# Altium integrated library Jack_LibraryLibPkg.IntLib: 77 symbols (continued)
## OPA2188AIDR (continued)
footprint SOIC8 (OPA2188AIDR) (SOIC, 8-Leads, Body 4.90x3.90mm, Pitch 1.27mm IPC Low Density)
pins on every part: 4 V- (power), 8 V+ (power)
part A pins: 1 OUT A (out), 2 IN A- (in), 3 IN A+ (in)
part B pins: 5 IN B+ (in), 6 IN B- (in), 7 OUT B (out)

## PL2303GL
designator U?
UART to USB 1.1 Bridge; Manufacturer: Prolific Tech; Supplier: LCSC; Supplier Part Number: C2905408; Manufacturer Part Number: PL2303GL
footprint SOP8 (SOP, 8-Leads, Body 4.90x3.90mm, Pitch 1.27mm, IPC Medium Density)
pins: 1 GND, 2 TX (out), 3 VDDIO, 4 RX (in), 5 DP, 6 DM, 7 VIN, 8 VO_33

## Solder_Bridge
designator J?  (value not drawn)
footprint Solder Jumper
pins: 1, 2

## SS210
designator D?  (value not drawn)
Schottky Diode, 2A 100V; Manufacturer: MDD(Microdiode Semiconductor); Manufacturer Part Number: SS210; Supplier: LCSC; Supplier Part Number: C14996
footprint DO-214AC Diode (Molded Diode, 2-Leads, Body 4.15x2.55mm, IPC Medium Density)
pins: 1 A, 2 K

## STM32F103C8T6
designator U?
MCU 32-bit STM32F1 ARM Cortex M3 RISC 64KB Flash 2.5V/3.3V 48-Pin LQFP Tray; Manufacturer: STMicroelectronics; ComponentLink3Description: Package Specification; ComponentLink3URL: http://www.st.com/st-web-ui/static/active/en/resource/technical/document/datasheet/DM00058181.pdf; ComponentLink1URL: http://www.st.com/web/en/home.html; ComponentLink2URL: http://www.st.com/st-web-ui/static/active/en/resource/technical/document/datasheet/CD00161566.pdf; ComponentLink1Description: Manufacturer URL; ComponentLink2Description: Datasheet; Supplier: LCSC; Supplier Part Number: C8734; Manufacturer Part Number: STM32F103C8T6; ComponentLink4URL: https://datasheet.octopart.com:443/STM32F103C8T6-STMicroelectronics-datasheet-177520228.pdf?src-supplier=IHS; ComponentLink4Description: https://datasheet.octopart.com:443/STM32F103C8T6-STMicroelectronics-datasheet-177520228.pdf?src-supplier=IHS; ComponentLink5URL: https://datasheet.octopart.com:443/STM32F103C8T6-STMicroelectronics-datasheet-10330614.pdf?src-supplier=Newark; ComponentLink5Description: https://datasheet.octopart.com:443/STM32F103C8T6-STMicroelectronics-datasheet-10330614.pdf?src-supplier=Newark; ComponentLink6URL: https://datasheet.octopart.com:443/STM32F103C8T6-STMicroelectronics-datasheet-16839800.pdf?src-supplier=Newark; ComponentLink6Description: https://datasheet.octopart.com:443/STM32F103C8T6-STMicroelectronics-datasheet-16839800.pdf?src-supplier=Newark; ComponentLink7URL: https://datasheet.octopart.com:443/STM32F103C8T6-STMicroelectronics-datasheet-48026265.pdf?src-supplier=ICpick; ComponentLink7Description: https://datasheet.octopart.com:443/STM32F103C8T6-STMicroelectronics-datasheet-48026265.pdf?src-supplier=ICpick; ComponentLink8URL: https://datasheet.octopart.com:443/STM32F103C8T6-STMicroelectronics-datasheet-14363502.pdf?src-supplier=Farnell; ComponentLink8Description: https://datasheet.octopart.com:443/STM32F103C8T6-STMicroelectronics-datasheet-14363502.pdf?src-supplier=Farnell; ComponentLink9URL: https://datasheet.octopart.com:443/STM32F103C8T6-STMicroelectronics-datasheet-500013.pdf?src-supplier=Farnell; ComponentLink9Description: https://datasheet.octopart.com:443/STM32F103C8T6-STMicroelectronics-datasheet-500013.pdf?src-supplier=Farnell; ComponentLink10URL: https://datasheet.octopart.com:443/STM32F103C8T6-STMicroelectronics-datasheet-8365036.pdf?src-supplier=Farnell; ComponentLink10Description: https://datasheet.octopart.com:443/STM32F103C8T6-STMicroelectronics-datasheet-8365036.pdf?src-supplier=Farnell; ComponentLink11URL: https://datasheet.octopart.com:443/STM32F103C8T6-STMicroelectronics-datasheet-6396519.pdf?src-supplier=Verical; ComponentLink11Description: https://datasheet.octopart.com:443/STM32F103C8T6-STMicroelectronics-datasheet-6396519.pdf?src-supplier=Verical; ComponentLink12URL: https://datasheet.octopart.com:443/STM32F103C8T6-STMicroelectronics-datasheet-21407612.pdf?src-supplier=element14+APAC; ComponentLink12Description: https://datasheet.octopart.com:443/STM32F103C8T6-STMicroelectronics-datasheet-21407612.pdf?src-supplier=element14+APAC; ComponentLink13URL: https://datasheet.octopart.com:443/STM32F103C8T6-STMicroelectronics-datasheet-8700640.pdf?src-supplier=element14; ComponentLink13Description: https://datasheet.octopart.com:443/STM32F103C8T6-STMicroelectronics-datasheet-8700640.pdf?src-supplier=element14; ComponentLink14URL: https://datasheet.octopart.com:443/STM32F103C8T6-STMicroelectronics-datasheet-165583531.pdf?src-supplier=SOS+electronic; ComponentLink14Description: https://datasheet.octopart.com:443/STM32F103C8T6-STMicroelectronics-datasheet-165583531.pdf?src-supplier=SOS+electronic; ComponentLink15URL: https://datasheet.octopart.com:443/STM32F103C8T6-STMicroelectronics-datasheet-14106722.pdf?src-supplier=iiiC; ComponentLink15Description: https://datasheet.octopart.com:443/STM32F103C8T6-STMicroelectronics-datasheet-14106722.pdf?src-supplier=iiiC; ComponentLink16URL: https://datasheet.octopart.com:443/STM32F103C8T6-STMicroelectronics-datasheet-17594274.pdf?src-supplier=TME; ComponentLink16Description: https://datasheet.octopart.com:443/STM32F103C8T6-STMicroelectronics-datasheet-17594274.pdf?src-supplier=TME; ComponentLink17URL: https://datasheet.octopart.com:443/STM32F103C8T6-STMicroelectronics-datasheet-148251.pdf?src-supplier=Nu+Horizons; ComponentLink17Description: https://datasheet.octopart.com:443/STM32F103C8T6-STMicroelectronics-datasheet-148251.pdf?src-supplier=Nu+Horizons
footprint LQFP48 (STM32F103C8T6) (TSQFP, 48-Leads, Body 7.00x7.00mm, Pitch 0.50mm, IPC Medium Density)
part A pins: 2 PC13-TAMPER-RTC (io) "PC13-TAMPER-RTC/PC13/TAMPER-RTC", 3 PC14-OSC32_IN (io) "PC14-OSC32_IN/PC14/OSC32_IN", 4 PC15-OSC32_OUT (io) "PC15-OSC32_OUT/PC15/OSC32_OUT", 5 PD0-OSC_IN (io) "PD0/OSC_IN", 6 PD1-OSC_OUT (io) "PD1/OSC_OUT", 7 NRST (io), 10 PA0-WKUP (io) "PA0-WKUP/PA0/WKUP/USART2_CTS/ADC12_IN0/TIM2_CH1_ETR", 11 PA1 (io) "PA1/USART2_RTS/ADC12_IN1/TIM2_CH2", 12 PA2 (io) "PA2/USART2_TX/ADC12_IN2/TIM2_CH3", 13 PA3 (io) "PA3/USART2_RX/ADC12_IN3/TIM2_CH4", 14 PA4 (io) "PA4/SPI1_NSS/USART2_CK/ADC12_IN4", 15 PA5 (io) "PA5/SPI1_SCK/ADC12_IN5", 16 PA6 (io) "PA6/SPI1_MISO/ADC12_IN6/TIM3_CH1/TIM1_BKIN", 17 PA7 (io) "PA7/SPI1_MOSI/ADC12_IN7/TIM3_CH2/TIM1_CH1N", 18 PB0 (io) "PB0/ADC12_IN8/TIM3_CH3/TIM1_CH2N", 19 PB1 (io) "PB1/ADC12_IN9/TIM3_CH4/TIM1_CH3N", 20 PB2 (io) "PB2/BOOT1", 21 PB10 (io) "PB10/I2C2_SCL/USART3_TX/TIM2_CH3", 22 PB11 (io) "PB11/I2C2_SDA/USART3_RX/TIM2_CH4", 25 PB12 (io) "PB12/SPI2_NSS/I2C2_SMBAl/USART3_CK/TIM1_BKIN", 26 PB13 (io) "PB13/SPI2_SCK/USART3_CTS/TIM1_CH1N", 27 PB14 (io) "PB14/SPI2_MISO/USART3_RTS/TIM1_CH2N", 28 PB15 (io) "PB15/SPI2_MOSI/TIM1_CH3N", 29 PA8 (io) "PA8/USART1_CK/TIM1_CH1/MCO", 30 PA9 (io) "PA9/USART1_TX/TIM1_CH2", 31 PA10 (io) "PA10/USART1_RX/TIM1_CH3", 32 PA11 (io) "PA11/USART1_CTS/CANRX/USBDM/TIM1_CH4", 33 PA12 (io) "PA12/USART1_RTS/CANTX/USBDP/TIM1_ETR", 34 PA13 (io) "PA13/JTMS/SWDIO", 37 PA14 (io) "PA14/JTCK/SWCLK", 38 PA15 (io) "PA15/JTDI/TIM2_CH1_ETR/SPI1_NSS", 39 PB3 (io) "PB3/JTDO/TIM2_CH2/TRACESWO/SPI1_SCK", 40 PB4 (io) "PB4/NJTRST/TIM3_CH1/SPI1_MISO", 41 PB5 (io) "PB5/I2C1_SMBAI/TIM3_CH2/SPI1_MOSI", 42 PB6 (io) "PB6/I2C1_SCL/TIM4_CH1/USART1_TX", 43 PB7 (io) "PB7/I2C1_SDA/TIM4_CH2/USART1_RX", 44 BOOT0 (in), 45 PB8 (io) "PB8/TIM4_CH3/I2C1_SCL/CANRX", 46 PB9 (io) "PB9/TIM4_CH4/I2C1_SDA/CANTX"
part B pins: 1 VBAT (power), 8 VSSA (power), 9 VDDA (power), 23 VSS_1 (power), 24 VDD_1 (power), 35 VSS_2 (power), 36 VDD_2 (power), 47 VSS_3 (power), 48 VDD_3 (power)

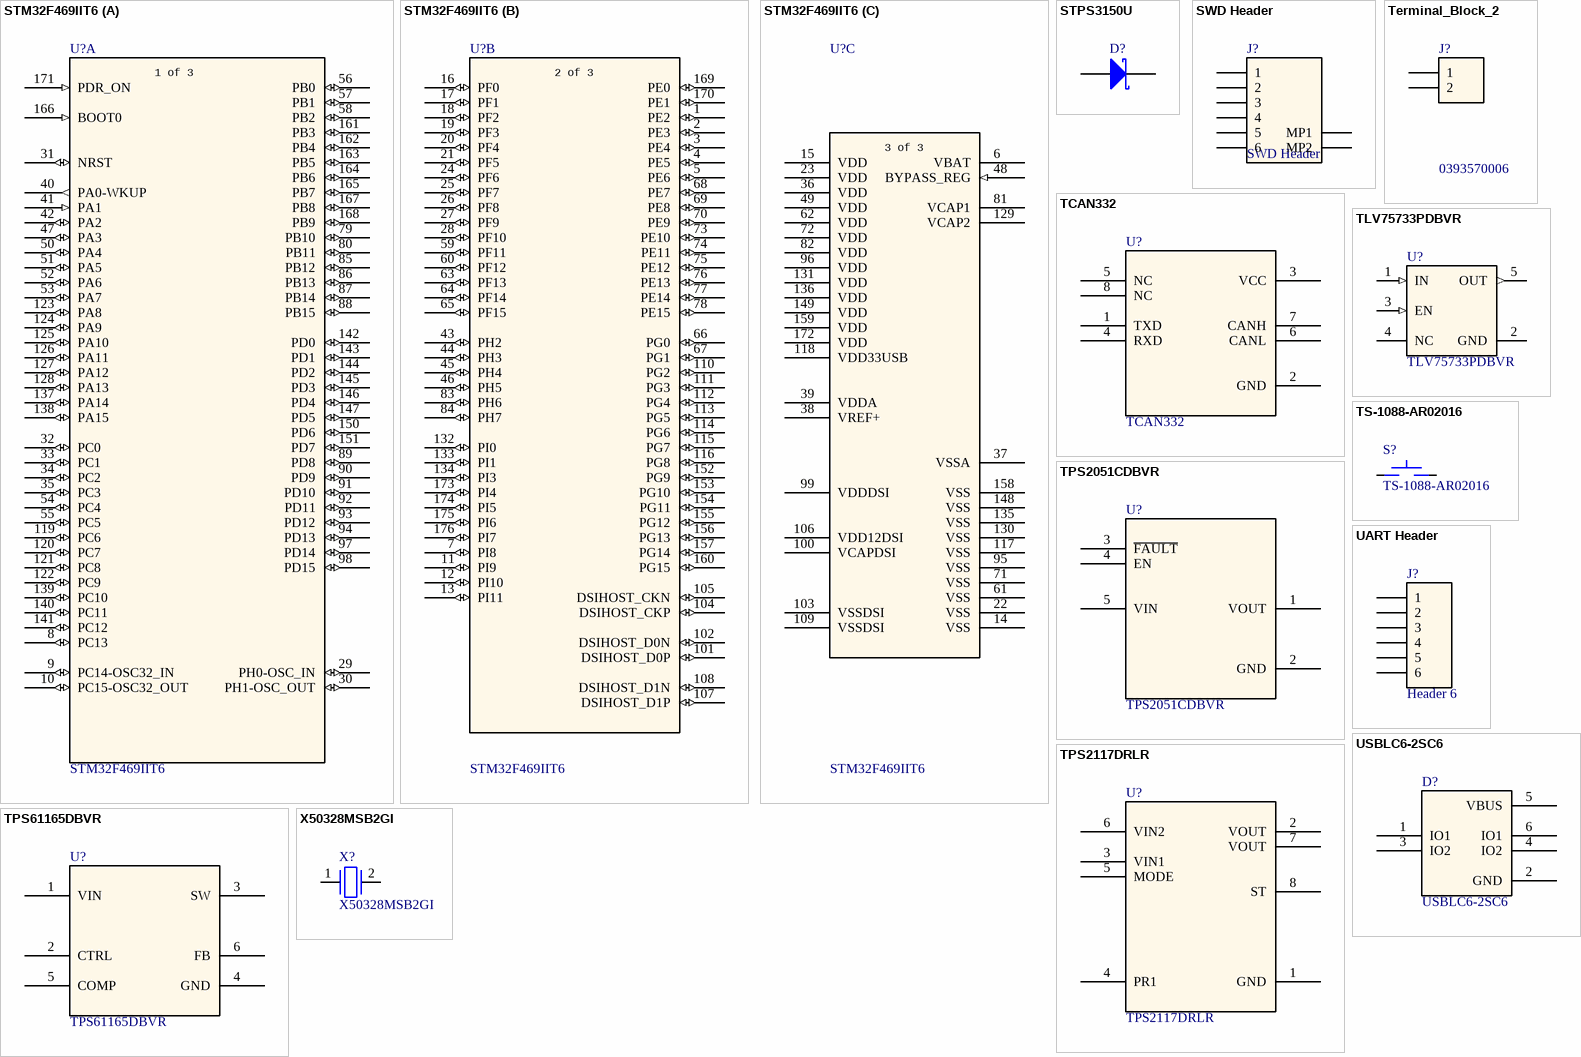
[diagram p2: symbols STM32F469IIT6 to X50328MSB2GI]

## STM32F469IIT6
designator U?
MCU 32-bit ARM Cortex M4 RISC 2MB Flash 2.5V/3.3V 176-Pin LQFP Frame; Manufacturer: STMicroelectronics; Manufacturer Part Number: STM32F469IIT6; Supplier: LCSC; Supplier Part Number: C117839; ComponentLink1URL: https://datasheet.octopart.com:443/STM32F469IIT6-STMicroelectronics-datasheet-62336746.pdf?src-supplier=element14+APAC; ComponentLink1Description: https://datasheet.octopart.com:443/STM32F469IIT6-STMicroelectronics-datasheet-62336746.pdf?src-supplier=element14+APAC; ComponentLink2URL: https://datasheet.octopart.com:443/STM32F469IIT6-STMicroelectronics-datasheet-49152909.pdf?src-supplier=Newark; ComponentLink2Description: https://datasheet.octopart.com:443/STM32F469IIT6-STMicroelectronics-datasheet-49152909.pdf?src-supplier=Newark; ComponentLink3URL: https://datasheet.octopart.com:443/STM32F469IIT6-STMicroelectronics-datasheet-60574464.pdf?src-supplier=Farnell; ComponentLink3Description: https://datasheet.octopart.com:443/STM32F469IIT6-STMicroelectronics-datasheet-60574464.pdf?src-supplier=Farnell; ComponentLink4URL: https://datasheet.octopart.com:443/STM32F469IIT6-STMicroelectronics-datasheet-159009227.pdf?src-supplier=SHENGYU+ELECTRONICS; ComponentLink4Description: https://datasheet.octopart.com:443/STM32F469IIT6-STMicroelectronics-datasheet-159009227.pdf?src-supplier=SHENGYU+ELECTRONICS
footprint LQFP176 (TSQFP, 176-Leads, Body 24.00x24.00mm, Pitch 0.50mm, IPC Medium Density)
part A pins: 8 PC13 (io), 9 PC14-OSC32_IN (io), 10 PC15-OSC32_OUT (io), 29 PH0-OSC_IN (io), 30 PH1-OSC_OUT (io), 31 NRST (io), 32 PC0 (io), 33 PC1 (io), 34 PC2 (io), 35 PC3 (io), 40 PA0-WKUP (out), 41 PA1 (in), 42 PA2 (io), 47 PA3 (io), 50 PA4 (io), 51 PA5 (io), 52 PA6 (io), 53 PA7 (io), 54 PC4 (io), 55 PC5 (io), 56 PB0 (io), 57 PB1 (io), 58 PB2 (io), 79 PB10 (io), 80 PB11 (io), 85 PB12 (io), 86 PB13 (io), 87 PB14 (io), 88 PB15 (io), 89 PD8 (io), 90 PD9 (io), 91 PD10 (io), 92 PD11 (io), 93 PD12 (io), 94 PD13 (io), 97 PD14 (io), 98 PD15 (io), 119 PC6 (io), 120 PC7 (io), 121 PC8 (io), 122 PC9 (io), 123 PA8 (io), 124 PA9 (io), 125 PA10 (io), 126 PA11 (io), 127 PA12 (io), 128 PA13 (io), 137 PA14 (io), 138 PA15 (io), 139 PC10 (io), 140 PC11 (io), 141 PC12 (io), 142 PD0 (io), 143 PD1 (io), 144 PD2 (io), 145 PD3 (io), 146 PD4 (io), 147 PD5 (io), 150 PD6 (io), 151 PD7 (io), 161 PB3 (io), 162 PB4 (io), 163 PB5 (io), 164 PB6 (io), 165 PB7 (io), 166 BOOT0 (in), 167 PB8 (io), 168 PB9 (io), 171 PDR_ON (in)
part B pins: 1 PE2 (io), 2 PE3 (io), 3 PE4 (io), 4 PE5 (io), 5 PE6 (io), 7 PI8 (io), 11 PI9 (io), 12 PI10 (io), 13 PI11 (io), 16 PF0 (io), 17 PF1 (io), 18 PF2 (io), 19 PF3 (io), 20 PF4 (io), 21 PF5 (io), 24 PF6 (io), 25 PF7 (io), 26 PF8 (io), 27 PF9 (io), 28 PF10 (io), 43 PH2 (io), 44 PH3 (io), 45 PH4 (io), 46 PH5 (io), 59 PF11 (io), 60 PF12 (io), 63 PF13 (io), 64 PF14 (io), 65 PF15 (io), 66 PG0 (io), 67 PG1 (io), 68 PE7 (io), 69 PE8 (io), 70 PE9 (io), 73 PE10 (io), 74 PE11 (io), 75 PE12 (io), 76 PE13 (io), 77 PE14 (io), 78 PE15 (io), 83 PH6 (io), 84 PH7 (io), 101 DSIHOST_D0P (io), 102 DSIHOST_D0N (io), 104 DSIHOST_CKP (io), 105 DSIHOST_CKN (io), 107 DSIHOST_D1P (io), 108 DSIHOST_D1N (io), 110 PG2 (io), 111 PG3 (io), 112 PG4 (io), 113 PG5 (io), 114 PG6 (io), 115 PG7 (io), 116 PG8 (io), 132 PI0 (io), 133 PI1 (io), 134 PI3 (io), 152 PG9 (io), 153 PG10 (io), 154 PG11 (io), 155 PG12 (io), 156 PG13 (io), 157 PG14 (io), 160 PG15 (io), 169 PE0 (io), 170 PE1 (io), 173 PI4 (io), 174 PI5 (io), 175 PI6 (io), 176 PI7 (io)
part C pins: 6 VBAT (power), 14 VSS (power), 15 VDD (power), 22 VSS (power), 23 VDD (power), 36 VDD (power), 37 VSSA (power), 38 VREF+ (power), 39 VDDA (power), 48 BYPASS_REG (in), 49 VDD (power), 61 VSS (power), 62 VDD (power), 71 VSS (power), 72 VDD (power), 81 VCAP1 (power), 82 VDD (power), 95 VSS (power), 96 VDD (power), 99 VDDDSI (power), 100 VCAPDSI (power), 103 VSSDSI (power), 106 VDD12DSI (power), 109 VSSDSI (power), 117 VSS (power), 118 VDD33USB (power), 129 VCAP2 (power), 130 VSS (power), 131 VDD (power), 135 VSS (power), 136 VDD (power), 148 VSS (power), 149 VDD (power), 158 VSS (power), 159 VDD (power), 172 VDD (power)
part A text: 1 of 3
part B text: 2 of 3
part C text: 3 of 3

## STPS3150U
designator D?  (value not drawn)
DIODE SCHOTTKY 150V 3A SMBFLAT / Rectifier Diode Schottky 150V 3A Automotive 2-Pin SMB T/R; Manufacturer: STMicroelectronics; Supplier: LCSC; Supplier Part Number: C40041; Manufacturer Part Number: STPS3150U; ComponentLink1URL: https://datasheet.octopart.com:443/STPS3150U-STMicroelectronics-datasheet-62337139.pdf?src-supplier=STMicroelectronics; ComponentLink1Description: https://datasheet.octopart.com:443/STPS3150U-STMicroelectronics-datasheet-62337139.pdf?src-supplier=STMicroelectronics; ComponentLink2URL: https://datasheet.octopart.com:443/STPS3150U-STMicroelectronics-datasheet-10490298.pdf?src-supplier=Newark; ComponentLink2Description: https://datasheet.octopart.com:443/STPS3150U-STMicroelectronics-datasheet-10490298.pdf?src-supplier=Newark; ComponentLink3URL: https://datasheet.octopart.com:443/STPS3150U-STMicroelectronics-datasheet-66351763.pdf?src-supplier=TME; ComponentLink3Description: https://datasheet.octopart.com:443/STPS3150U-STMicroelectronics-datasheet-66351763.pdf?src-supplier=TME; ComponentLink4URL: https://datasheet.octopart.com:443/STPS3150U-STMicroelectronics-datasheet-48879.pdf?src-supplier=Nu+Horizons; ComponentLink4Description: https://datasheet.octopart.com:443/STPS3150U-STMicroelectronics-datasheet-48879.pdf?src-supplier=Nu+Horizons; ComponentLink5URL: https://datasheet.octopart.com:443/STPS3150U-STMicroelectronics-datasheet-127521.pdf?src-supplier=Farnell; ComponentLink5Description: https://datasheet.octopart.com:443/STPS3150U-STMicroelectronics-datasheet-127521.pdf?src-supplier=Farnell; ComponentLink6URL: https://datasheet.octopart.com:443/STPS3150U-STMicroelectronics-datasheet-14054768.pdf?src-supplier=iiiC; ComponentLink6Description: https://datasheet.octopart.com:443/STPS3150U-STMicroelectronics-datasheet-14054768.pdf?src-supplier=iiiC; ComponentLink7URL: https://datasheet.octopart.com:443/STPS3150U-STMicroelectronics-datasheet-21339.pdf?src-supplier=Mouser; ComponentLink7Description: https://datasheet.octopart.com:443/STPS3150U-STMicroelectronics-datasheet-21339.pdf?src-supplier=Mouser
footprint SMB Diode (STPS3150U) (Molded Diode, 2-Leads, Body 5.35x3.63mm, IPC Medium Density)
pins: 1 K, 2 A

## SWD Header
designator J?
1 1.2mm 1x6P 2.5mm 6 6P Black Copper alloy Gold LCP Surface Mount, Right Angle UL94V-0 SMD,P=1.2mm,Surface Mount，Right Angle Wire To Board Connector ROHS; Manufacturer: Amphenol ICC; Manufacturer Part Number: 10125839-06RAEHLF; Supplier: LCSC; Supplier Part Number: C180227
footprint 6 pin SWD connector
pins: 1, 2, 3, 4, 5, 6, MP1, MP2

## TCAN332
designator U?
e4 TCAN332 Tape & Reel (TR) CANbus interface transceiver 120mV 1.45mm -40C~125C; Manufacturer: Texas Instruments; Manufacturer Part Number: TCAN332DCNR; Supplier: LCSC; Supplier Part Number: C544741; ComponentLink1URL: https://octopart.com:443/opatz8j6/c1?t=dG_SbUxjQzVgJnJPP-2szSeqPAb3X7H8tWfQI62VRO9uZnrLmFg3TWU_z67q9kIDviF4FN_TCsqeSfeEDt3cWUaO61NG9QDI_Eb50Secyx7936ozK0zPGmHWFTaG3DsBBHgi4s8MSZ62e4_WQc34t8bGaKb-7TAP0eyksxQ1enmXlBpFOua48LsekYnSoJ2L-d640ZUPpAGxHdgwmtr-Rm6Has3v9oCmMUHqPAq5ix4xFEIyP5I_SVLeVktE-3aAwIYQSiOANKmcXVzf_801AnYlO65In04uFc_5rjJ_JVYSqe5kmTcE2eLvcvt7n5SpzoA4fGOFnErTL0ZS-9x5xsgIoYsvbbTZ1_6kN_AAgYZyOVAEksG_LnTkXIJbDMRPYtvLom8&src-supplier=Texas+Instruments; ComponentLink1Description: https://octopart.com:443/opatz8j6/c1?t=dG_SbUxjQzVgJnJPP-2szSeqPAb3X7H8tWfQI62VRO9uZnrLmFg3TWU_z67q9kIDviF4FN_TCsqeSfeEDt3cWUaO61NG9QDI_Eb50Secyx7936ozK0zPGmHWFTaG3DsBBHgi4s8MSZ62e4_WQc34t8bGaKb-7TAP0eyksxQ1enmXlBpFOua48LsekYnSoJ2L-d640ZUPpAGxHdgwmtr-Rm6Has3v9oCmMUHqPAq5ix4xFEIyP5I_SVLeVktE-3aAwIYQSiOANKmcXVzf_801AnYlO65In04uFc_5rjJ_JVYSqe5kmTcE2eLvcvt7n5SpzoA4fGOFnErTL0ZS-9x5xsgIoYsvbbTZ1_6kN_AAgYZyOVAEksG_LnTkXIJbDMRPYtvLom8&src-supplier=Texas+Instruments; ComponentLink2URL: https://datasheet.octopart.com:443/TCAN332DCNR-Texas-Instruments-datasheet-61500394.pdf?src-supplier=Texas+Instruments; ComponentLink2Description: https://datasheet.octopart.com:443/TCAN332DCNR-Texas-Instruments-datasheet-61500394.pdf?src-supplier=Texas+Instruments; ComponentLink3URL: https://sigma.octopart.com:443/49252122/technical_drawing/Texas-Instruments-TCAN332DCNR.pdf?src-supplier=Texas+Instruments; ComponentLink3Description: https://sigma.octopart.com:443/49252122/technical_drawing/Texas-Instruments-TCAN332DCNR.pdf?src-supplier=Texas+Instruments; ComponentLink4URL: https://datasheet.octopart.com:443/TCAN332DCNR-Texas-Instruments-datasheet-149637585.pdf?src-supplier=Upverter; ComponentLink4Description: https://datasheet.octopart.com:443/TCAN332DCNR-Texas-Instruments-datasheet-149637585.pdf?src-supplier=Upverter; ComponentLink5URL: https://datasheet.octopart.com:443/TCAN332DCNR-Texas-Instruments-datasheet-192327331.pdf?src-supplier=HQonline; ComponentLink5Description: https://datasheet.octopart.com:443/TCAN332DCNR-Texas-Instruments-datasheet-192327331.pdf?src-supplier=HQonline; ComponentLink6URL: https://datasheet.octopart.com:443/TCAN332DCNR-Texas-Instruments-datasheet-164418215.pdf?src-supplier=SHENGYU+ELECTRONICS; ComponentLink6Description: https://datasheet.octopart.com:443/TCAN332DCNR-Texas-Instruments-datasheet-164418215.pdf?src-supplier=SHENGYU+ELECTRONICS; ComponentLink7URL: http://sigma.octopart.com:80/reach_statement/Texas-Instruments-company-64.pdf?src-supplier=Compliance+Statements; ComponentLink7Description: http://sigma.octopart.com:80/reach_statement/Texas-Instruments-company-64.pdf?src-supplier=Compliance+Statements; ComponentLink8URL: http://sigma.octopart.com:80/conflict_mineral_statement/Texas-Instruments-company-63.pdf?src-supplier=Compliance+Statements; ComponentLink8Description: http://sigma.octopart.com:80/conflict_mineral_statement/Texas-Instruments-company-63.pdf?src-supplier=Compliance+Statements
footprint SOT23-8 (SOT23, 8-Leads, Body 2.93x2.80mm, Pitch 0.95mm, IPC Medium Density)
pins: 1 TXD, 2 GND, 3 VCC, 4 RXD, 5 NC, 6 CANL, 7 CANH, 8 NC

## Terminal_Block_2
designator J?, comment 0393570006
TERM BLK 2POS SIDE ENT 3.5MM PCB; Manufacturer: Molex; Manufacturer Part Number: 0393570002; Supplier: DigiKey; Supplier Part Number: WM7877-ND
footprint 0393570002
pins: 1, 2

## TLV75733PDBVR
designator U?
1-A, low-IQ high-accuracy low-dropout (LDO) voltage regulator with enable 5-SOT-23 -40 to 125; Manufacturer: Texas Instruments; Supplier: LCSC; Supplier Part Number: C485517; Manufacturer Part Number: TLV75733PDBVR; ComponentLink1URL: https://sigma.octopart.com:443/177332311/technical_drawing/Texas-Instruments-TLV75733PDBVR.pdf?src-supplier=Texas+Instruments; ComponentLink1Description: https://sigma.octopart.com:443/177332311/technical_drawing/Texas-Instruments-TLV75733PDBVR.pdf?src-supplier=Texas+Instruments; ComponentLink2URL: https://octopart.com:443/opatz8j6/c1?t=6lDysvEzJMqV3aXU7XwswX-NmoIVKIpd3xMvh1jAIanRe4xqKcgWItUPj8N2Urd19DgEQX7Si0USgCZNUOCflsoBJm1ijCIgGCUOB1WaCybT4cY9c_KHWWyCTPMmLtAeSRmCMbORwkbpXPuDyLPTDJz2-yywwnrOMDSerR3rCfsbOmzOtwiuPfr5QO4UlCRj3n_a4RYvCi2S1TtCu7mUS0uhSmcIA5DP_e85TwisM18oaq8hQoRDdOm0GDJCJDLnhdkPe_6JZyh9RLZ6A19nNgObwn704rdDc8n-wDuSG4qMO_GAqGfOTEiVWd-LL-II0Cb0Q5yJpDhKRKft5bJVAG82wJ2i-Vgi_ReSvuynMFzgY6dAU0sHSHvmH4001BANddGd7Q&src-supplier=Texas+Instruments; ComponentLink2Description: https://octopart.com:443/opatz8j6/c1?t=6lDysvEzJMqV3aXU7XwswX-NmoIVKIpd3xMvh1jAIanRe4xqKcgWItUPj8N2Urd19DgEQX7Si0USgCZNUOCflsoBJm1ijCIgGCUOB1WaCybT4cY9c_KHWWyCTPMmLtAeSRmCMbORwkbpXPuDyLPTDJz2-yywwnrOMDSerR3rCfsbOmzOtwiuPfr5QO4UlCRj3n_a4RYvCi2S1TtCu7mUS0uhSmcIA5DP_e85TwisM18oaq8hQoRDdOm0GDJCJDLnhdkPe_6JZyh9RLZ6A19nNgObwn704rdDc8n-wDuSG4qMO_GAqGfOTEiVWd-LL-II0Cb0Q5yJpDhKRKft5bJVAG82wJ2i-Vgi_ReSvuynMFzgY6dAU0sHSHvmH4001BANddGd7Q&src-supplier=Texas+Instruments; ComponentLink3URL: https://sigma.octopart.com:443/175570406/technical_drawing/Texas-Instruments-TLV75733PDBVR.pdf?src-supplier=Texas+Instruments; ComponentLink3Description: https://sigma.octopart.com:443/175570406/technical_drawing/Texas-Instruments-TLV75733PDBVR.pdf?src-supplier=Texas+Instruments; ComponentLink4URL: https://sigma.octopart.com:443/169406034/technical_drawing/Texas-Instruments-TLV75733PDBVR.pdf?src-supplier=Texas+Instruments; ComponentLink4Description: https://sigma.octopart.com:443/169406034/technical_drawing/Texas-Instruments-TLV75733PDBVR.pdf?src-supplier=Texas+Instruments; ComponentLink5URL: https://sigma.octopart.com:443/155939316/technical_drawing/Texas-Instruments-TLV75733PDBVR.pdf?src-supplier=Texas+Instruments; ComponentLink5Description: https://sigma.octopart.com:443/155939316/technical_drawing/Texas-Instruments-TLV75733PDBVR.pdf?src-supplier=Texas+Instruments; ComponentLink6URL: https://sigma.octopart.com:443/102331370/technical_drawing/Texas-Instruments-TLV75733PDBVR.pdf?src-supplier=Texas+Instruments; ComponentLink6Description: https://sigma.octopart.com:443/102331370/technical_drawing/Texas-Instruments-TLV75733PDBVR.pdf?src-supplier=Texas+Instruments; ComponentLink7URL: https://datasheet.octopart.com:443/TLV75733PDBVR-Texas-Instruments-datasheet-164419132.pdf?src-supplier=Augswan; ComponentLink7Description: https://datasheet.octopart.com:443/TLV75733PDBVR-Texas-Instruments-datasheet-164419132.pdf?src-supplier=Augswan; ComponentLink8URL: https://datasheet.octopart.com:443/TLV75733PDBVR-Texas-Instruments-datasheet-165804641.pdf?src-supplier=LCSC; ComponentLink8Description: https://datasheet.octopart.com:443/TLV75733PDBVR-Texas-Instruments-datasheet-165804641.pdf?src-supplier=LCSC; ComponentLink9URL: https://datasheet.octopart.com:443/TLV75733PDBVR-Texas-Instruments-datasheet-159117837.pdf?src-supplier=LCSC; ComponentLink9Description: https://datasheet.octopart.com:443/TLV75733PDBVR-Texas-Instruments-datasheet-159117837.pdf?src-supplier=LCSC; ComponentLink10URL: http://sigma.octopart.com:80/reach_statement/Texas-Instruments-company-64.pdf?src-supplier=Compliance+Statements; ComponentLink10Description: http://sigma.octopart.com:80/reach_statement/Texas-Instruments-company-64.pdf?src-supplier=Compliance+Statements; ComponentLink11URL: http://sigma.octopart.com:80/conflict_mineral_statement/Texas-Instruments-company-63.pdf?src-supplier=Compliance+Statements; ComponentLink11Description: http://sigma.octopart.com:80/conflict_mineral_statement/Texas-Instruments-company-63.pdf?src-supplier=Compliance+Statements
footprint SOT23-5 (SOT23, 5-Leads, Body 2.90x2.80mm, Pitch 0.95mm, IPC Medium Density)
pins: 1 IN (in), 2 GND (power), 3 EN (in), 4 NC, 5 OUT (out)

## TPS2051CDBVR
designator U?
-40℃~+125℃ 1 4.5V~5.5V 500mA 97mΩ Active High Low Side Switch Short-Circuit  Protection(SCP)、Overcurrent Protection(OCP)、Overtemperature protection (OTP) SOT-23-5 Power Distribution Switches ROHS; Manufacturer: Texas Instruments; Supplier: LCSC; Supplier Part Number: C129581; Manufacturer Part Number: TPS2051CDBVR
footprint SOT23-5 (SOT23, 5-Leads, Body 2.90x2.80mm, Pitch 0.95mm, IPC Medium Density)
pins: 1 VOUT, 2 GND, 3 ~{FAULT} (oc), 4 EN, 5 VIN

## TPS2117DRLR
designator U?
1.6-V TO 5.5-V, 20-M, 4-A LOW IQ Power Switch/Driver 2: 1 N-Channel 4A SOT-583; Manufacturer: Texas Instruments; Supplier: LCSC; Supplier Part Number: C22399676; Manufacturer Part Number: TPS2117DRLR; ComponentLink1URL: https://sigma.octopart.com:443/184160452/technical_drawing/Texas-Instruments-TPS2117DRLR.pdf?src-supplier=Texas+Instruments; ComponentLink1Description: https://sigma.octopart.com:443/184160452/technical_drawing/Texas-Instruments-TPS2117DRLR.pdf?src-supplier=Texas+Instruments; ComponentLink2URL: https://octopart.com:443/opatz8j6/c1?t=L84LYtfkBmmN_IjgYvQ-qdp29-_Y1qHOaIt1_kNS9fW6zCHH_mOxrWMnMXuUZ1bqiEFDwRIsiy_UYmJymrv8Px2m6PKuTwrplg6rpq_wJlsFnSfi8CP8aqb9xzzk84DEUT5Z06X-gaI3P2F3RmYXsrt5GEkx1caOnwsJv5FBB6WWt408fP1sLc0qFlmrkljEq25MyY9g_7CIAnoVZsSi_yOB6RSqpfmUjSqEw4B7hgY_otftM--RI0f-E42yI6CWCkB5E_2kPGFfxKzu01GXmLqmVT1vRVkZ_bUmRdOInDeSTeJtLAoJ2NRY4FaXen_61Ah6oVg27V3ihoFZI3QFUUuUGv9_Vto7490L0vpBTrDJknOeRs_5eMCBoUnWlBEHBK2pkr4H&src-supplier=Texas+Instruments; ComponentLink2Description: https://octopart.com:443/opatz8j6/c1?t=L84LYtfkBmmN_IjgYvQ-qdp29-_Y1qHOaIt1_kNS9fW6zCHH_mOxrWMnMXuUZ1bqiEFDwRIsiy_UYmJymrv8Px2m6PKuTwrplg6rpq_wJlsFnSfi8CP8aqb9xzzk84DEUT5Z06X-gaI3P2F3RmYXsrt5GEkx1caOnwsJv5FBB6WWt408fP1sLc0qFlmrkljEq25MyY9g_7CIAnoVZsSi_yOB6RSqpfmUjSqEw4B7hgY_otftM--RI0f-E42yI6CWCkB5E_2kPGFfxKzu01GXmLqmVT1vRVkZ_bUmRdOInDeSTeJtLAoJ2NRY4FaXen_61Ah6oVg27V3ihoFZI3QFUUuUGv9_Vto7490L0vpBTrDJknOeRs_5eMCBoUnWlBEHBK2pkr4H&src-supplier=Texas+Instruments; ComponentLink3URL: https://sigma.octopart.com:443/182665545/technical_drawing/Texas-Instruments-TPS2117DRLR.pdf?src-supplier=Texas+Instruments; ComponentLink3Description: https://sigma.octopart.com:443/182665545/technical_drawing/Texas-Instruments-TPS2117DRLR.pdf?src-supplier=Texas+Instruments; ComponentLink4URL: https://sigma.octopart.com:443/158891806/technical_drawing/Texas-Instruments-TPS2117DRLR.pdf?src-supplier=Texas+Instruments; ComponentLink4Description: https://sigma.octopart.com:443/158891806/technical_drawing/Texas-Instruments-TPS2117DRLR.pdf?src-supplier=Texas+Instruments; ComponentLink5URL: https://datasheet.octopart.com:443/TPS2117DRLR-Texas-Instruments-datasheet-189768138.pdf?src-supplier=ODG+(Origin+Data+Global); ComponentLink5Description: https://datasheet.octopart.com:443/TPS2117DRLR-Texas-Instruments-datasheet-189768138.pdf?src-supplier=ODG+(Origin+Data+Global); ComponentLink6URL: https://datasheet.octopart.com:443/TPS2117DRLR-Texas-Instruments-datasheet-184244544.pdf?src-supplier=LCSC; ComponentLink6Description: https://datasheet.octopart.com:443/TPS2117DRLR-Texas-Instruments-datasheet-184244544.pdf?src-supplier=LCSC; ComponentLink7URL: http://sigma.octopart.com:80/reach_statement/Texas-Instruments-company-64.pdf?src-supplier=Compliance+Statements; ComponentLink7Description: http://sigma.octopart.com:80/reach_statement/Texas-Instruments-company-64.pdf?src-supplier=Compliance+Statements; ComponentLink8URL: http://sigma.octopart.com:80/conflict_mineral_statement/Texas-Instruments-company-63.pdf?src-supplier=Compliance+Statements; ComponentLink8Description: http://sigma.octopart.com:80/conflict_mineral_statement/Texas-Instruments-company-63.pdf?src-supplier=Compliance+Statements
footprint SOT 5x3
pins: 1 GND, 2 VOUT, 3 VIN1, 4 PR1, 5 MODE, 6 VIN2, 7 VOUT, 8 ST

## TPS61165DBVR
designator U?
High brightness white LED driver in 2mm x 2mm QFN Package 6-SOT-23 -40 to 85; Manufacturer: Texas Instruments; Supplier: LCSC; Supplier Part Number: C58756; Manufacturer Part Number: TPS61165DBVR; ComponentLink1URL: https://sigma.octopart.com:443/182282880/technical_drawing/Texas-Instruments-TPS61165DBVR.pdf?src-supplier=Texas+Instruments; ComponentLink1Description: https://sigma.octopart.com:443/182282880/technical_drawing/Texas-Instruments-TPS61165DBVR.pdf?src-supplier=Texas+Instruments; ComponentLink2URL: https://octopart.com:443/opatz8j6/c1?t=nZeBVG_tagQVTQ7mH9eZZHeC0rDHwyaHKKSCvJlus6yh4w9BlKbO9IoyfQfeWqyjliqoQHyW2yGXoo95ovqlmq8kd5JhrdGsq82YO7buThP_o15Nce2TNG5oXKLW-nVpH_-XeEWyNuigOz1gFahmc_VM1w7rjl1WSvgkxj9hAECfEFQYzC4pYHq4sIzxTBobuB3DrMlscfuTDSz6w8A9d2WE1BgVhZEcqdg3gxFJ-Z8IbNB3GOoLqbgLeBd7lkDfuvqqHLOWEUynituVoUNjcvozGSGw89fiZimS5DNerO7cPC7jIb1D2zbQLCq4rH_-a8Aro95-DwK9lGTU4b1BabtghUPJhpq2AuxQc8qAQWHR2BDxrIFi_slgdZiuh9wb6m9q9IRc&src-supplier=Texas+Instruments; ComponentLink2Description: https://octopart.com:443/opatz8j6/c1?t=nZeBVG_tagQVTQ7mH9eZZHeC0rDHwyaHKKSCvJlus6yh4w9BlKbO9IoyfQfeWqyjliqoQHyW2yGXoo95ovqlmq8kd5JhrdGsq82YO7buThP_o15Nce2TNG5oXKLW-nVpH_-XeEWyNuigOz1gFahmc_VM1w7rjl1WSvgkxj9hAECfEFQYzC4pYHq4sIzxTBobuB3DrMlscfuTDSz6w8A9d2WE1BgVhZEcqdg3gxFJ-Z8IbNB3GOoLqbgLeBd7lkDfuvqqHLOWEUynituVoUNjcvozGSGw89fiZimS5DNerO7cPC7jIb1D2zbQLCq4rH_-a8Aro95-DwK9lGTU4b1BabtghUPJhpq2AuxQc8qAQWHR2BDxrIFi_slgdZiuh9wb6m9q9IRc&src-supplier=Texas+Instruments; ComponentLink3URL: https://datasheet.octopart.com:443/TPS61165DBVR-Texas-Instruments-datasheet-37741753.pdf?src-supplier=Texas+Instruments; ComponentLink3Description: https://datasheet.octopart.com:443/TPS61165DBVR-Texas-Instruments-datasheet-37741753.pdf?src-supplier=Texas+Instruments; ComponentLink4URL: https://sigma.octopart.com:443/179253514/technical_drawing/Texas-Instruments-TPS61165DBVR.pdf?src-supplier=Texas+Instruments; ComponentLink4Description: https://sigma.octopart.com:443/179253514/technical_drawing/Texas-Instruments-TPS61165DBVR.pdf?src-supplier=Texas+Instruments; ComponentLink5URL: https://sigma.octopart.com:443/177332312/technical_drawing/Texas-Instruments-TPS61165DBVR.pdf?src-supplier=Texas+Instruments; ComponentLink5Description: https://sigma.octopart.com:443/177332312/technical_drawing/Texas-Instruments-TPS61165DBVR.pdf?src-supplier=Texas+Instruments; ComponentLink6URL: https://sigma.octopart.com:443/175570407/technical_drawing/Texas-Instruments-TPS61165DBVR.pdf?src-supplier=Texas+Instruments; ComponentLink6Description: https://sigma.octopart.com:443/175570407/technical_drawing/Texas-Instruments-TPS61165DBVR.pdf?src-supplier=Texas+Instruments; ComponentLink7URL: https://sigma.octopart.com:443/154719501/technical_drawing/Texas-Instruments-TPS61165DBVR.pdf?src-supplier=Texas+Instruments; ComponentLink7Description: https://sigma.octopart.com:443/154719501/technical_drawing/Texas-Instruments-TPS61165DBVR.pdf?src-supplier=Texas+Instruments; ComponentLink8URL: https://datasheet.octopart.com:443/TPS61165DBVR-Texas-Instruments-datasheet-36993187.pdf?src-supplier=Texas+Instruments; ComponentLink8Description: https://datasheet.octopart.com:443/TPS61165DBVR-Texas-Instruments-datasheet-36993187.pdf?src-supplier=Texas+Instruments; ComponentLink9URL: https://sigma.octopart.com:443/49249327/technical_drawing/Texas-Instruments-TPS61165DBVR.pdf?src-supplier=Texas+Instruments; ComponentLink9Description: https://sigma.octopart.com:443/49249327/technical_drawing/Texas-Instruments-TPS61165DBVR.pdf?src-supplier=Texas+Instruments; ComponentLink10URL: https://datasheet.octopart.com:443/TPS61165DBVR-Texas-Instruments-datasheet-10670041.pdf?src-supplier=Texas+Instruments; ComponentLink10Description: https://datasheet.octopart.com:443/TPS61165DBVR-Texas-Instruments-datasheet-10670041.pdf?src-supplier=Texas+Instruments; ComponentLink11URL: https://datasheet.octopart.com:443/TPS61165DBVR-Texas-Instruments-datasheet-10620793.pdf?src-supplier=Texas+Instruments; ComponentLink11Description: https://datasheet.octopart.com:443/TPS61165DBVR-Texas-Instruments-datasheet-10620793.pdf?src-supplier=Texas+Instruments; ComponentLink12URL: https://datasheet.octopart.com:443/TPS61165DBVR-Texas-Instruments-datasheet-16079706.pdf?src-supplier=Upverter; ComponentLink12Description: https://datasheet.octopart.com:443/TPS61165DBVR-Texas-Instruments-datasheet-16079706.pdf?src-supplier=Upverter; ComponentLink13URL: https://datasheet.octopart.com:443/TPS61165DBVR-Texas-Instruments-datasheet-66617826.pdf?src-supplier=Newark; ComponentLink13Description: https://datasheet.octopart.com:443/TPS61165DBVR-Texas-Instruments-datasheet-66617826.pdf?src-supplier=Newark; ComponentLink14URL: https://datasheet.octopart.com:443/TPS61165DBVR-Texas-Instruments-datasheet-21262904.pdf?src-supplier=Farnell; ComponentLink14Description: https://datasheet.octopart.com:443/TPS61165DBVR-Texas-Instruments-datasheet-21262904.pdf?src-supplier=Farnell; ComponentLink15URL: https://datasheet.octopart.com:443/TPS61165DBVR-Texas-Instruments-datasheet-48578343.pdf?src-supplier=element14+APAC; ComponentLink15Description: https://datasheet.octopart.com:443/TPS61165DBVR-Texas-Instruments-datasheet-48578343.pdf?src-supplier=element14+APAC; ComponentLink16URL: https://datasheet.octopart.com:443/TPS61165DBVR-Texas-Instruments-datasheet-165804812.pdf?src-supplier=LCSC; ComponentLink16Description: https://datasheet.octopart.com:443/TPS61165DBVR-Texas-Instruments-datasheet-165804812.pdf?src-supplier=LCSC; ComponentLink17URL: https://datasheet.octopart.com:443/TPS61165DBVR-Texas-Instruments-datasheet-159118187.pdf?src-supplier=LCSC; ComponentLink17Description: https://datasheet.octopart.com:443/TPS61165DBVR-Texas-Instruments-datasheet-159118187.pdf?src-supplier=LCSC; ComponentLink18URL: https://datasheet.octopart.com:443/TPS61165DBVR-Texas-Instruments-datasheet-164420408.pdf?src-supplier=SHENGYU+ELECTRONICS; ComponentLink18Description: https://datasheet.octopart.com:443/TPS61165DBVR-Texas-Instruments-datasheet-164420408.pdf?src-supplier=SHENGYU+ELECTRONICS; ComponentLink19URL: https://datasheet.octopart.com:443/TPS61165DBVR-Texas-Instruments-datasheet-137316104.pdf?src-supplier=Future+Electronics; ComponentLink19Description: https://datasheet.octopart.com:443/TPS61165DBVR-Texas-Instruments-datasheet-137316104.pdf?src-supplier=Future+Electronics; ComponentLink20URL: https://datasheet.octopart.com:443/TPS61165DBVR-Texas-Instruments-datasheet-14155713.pdf?src-supplier=iiiC; ComponentLink20Description: https://datasheet.octopart.com:443/TPS61165DBVR-Texas-Instruments-datasheet-14155713.pdf?src-supplier=iiiC; ComponentLink21URL: http://sigma.octopart.com:80/reach_statement/Texas-Instruments-company-64.pdf?src-supplier=Compliance+Statements; ComponentLink21Description: http://sigma.octopart.com:80/reach_statement/Texas-Instruments-company-64.pdf?src-supplier=Compliance+Statements; ComponentLink22URL: http://sigma.octopart.com:80/conflict_mineral_statement/Texas-Instruments-company-63.pdf?src-supplier=Compliance+Statements; ComponentLink22Description: http://sigma.octopart.com:80/conflict_mineral_statement/Texas-Instruments-company-63.pdf?src-supplier=Compliance+Statements
footprint SOT23-6 (SOT23, 6-Leads, Body 2.93x2.80mm, Pitch 0.95mm, IPC Medium Density)
pins: 1 VIN, 2 CTRL, 3 SW, 4 GND, 5 COMP, 6 FB

## TS-1088-AR02016
designator S?
Without 50mA 4mm 100MΩ 100000 Times 12V 160gf 3mm 2mm Round Button Standing paste SPST SMD Tactile Switches ROHS; Manufacturer: Xunpu; Supplier: LCSC; Supplier Part Number: C720477; Manufacturer Part Number: TS-1088-AR02016
footprint TS-1088-AR02016 PUSHBUTTON
pins: 1, 2

## UART Header
designator J?, comment Header 6
Conn Unshrouded Header HDR 6 POS 2.54mm Solder ST Top Entry SMD T/R; Manufacturer: Amphenol Communications Solutions; Manufacturer Part Number: 95293-401A06LF; Supplier: LCSC; Supplier Part Number: C178297; ComponentLink1URL: https://datasheet.octopart.com:443/95293-401A06LF-Amphenol-Communications-Solutions-datasheet-159239804.pdf?src-supplier=IHS; ComponentLink1Description: https://datasheet.octopart.com:443/95293-401A06LF-Amphenol-Communications-Solutions-datasheet-159239804.pdf?src-supplier=IHS; ComponentLink2URL: https://datasheet.octopart.com:443/95293-401A06LF-Amphenol-Communications-Solutions-datasheet-154727413.pdf?src-supplier=Electro+Sonic; ComponentLink2Description: https://datasheet.octopart.com:443/95293-401A06LF-Amphenol-Communications-Solutions-datasheet-154727413.pdf?src-supplier=Electro+Sonic; ComponentLink3URL: https://datasheet.octopart.com:443/95293-401A06LF-Amphenol-Communications-Solutions-datasheet-140258519.pdf?src-supplier=Newark; ComponentLink3Description: https://datasheet.octopart.com:443/95293-401A06LF-Amphenol-Communications-Solutions-datasheet-140258519.pdf?src-supplier=Newark; ComponentLink4URL: https://datasheet.octopart.com:443/95293-401A06LF-Areva-datasheet-11550649.pdf?src-supplier=Factory+Futures; ComponentLink4Description: https://datasheet.octopart.com:443/95293-401A06LF-Areva-datasheet-11550649.pdf?src-supplier=Factory+Futures
footprint 95293-401A06LF
pins: 1, 2, 3, 4, 5, 6

## USBLC6-2SC6
designator D?
-40℃~+125℃ 150nA 17V 2 3.5pF 5.25V 5A 6V ESD IEC 61000-4-2 Unidirectional SOT-23-6L ESD and Surge Protection (TVS/ESD) ROHS; Manufacturer: STMicroelectronics; Supplier: LCSC; Supplier Part Number: C7519; Manufacturer Part Number: USBLC6-2SC6; ComponentLink1URL: https://datasheet.octopart.com:443/USBLC6-2P6-STMicroelectronics-datasheet-10412581.pdf?src-supplier=element14+APAC; ComponentLink1Description: https://datasheet.octopart.com:443/USBLC6-2P6-STMicroelectronics-datasheet-10412581.pdf?src-supplier=element14+APAC; ComponentLink2URL: https://datasheet.octopart.com:443/USBLC6-2P6-STMicroelectronics-datasheet-525477.pdf?src-supplier=Factory+Futures; ComponentLink2Description: https://datasheet.octopart.com:443/USBLC6-2P6-STMicroelectronics-datasheet-525477.pdf?src-supplier=Factory+Futures; ComponentLink3URL: https://datasheet.octopart.com:443/USBLC6-2P6-STMicroelectronics-datasheet-181961833.pdf?src-supplier=Newark; ComponentLink3Description: https://datasheet.octopart.com:443/USBLC6-2P6-STMicroelectronics-datasheet-181961833.pdf?src-supplier=Newark; ComponentLink4URL: https://datasheet.octopart.com:443/USBLC6-2P6-STMicroelectronics-datasheet-46285.pdf?src-supplier=Farnell; ComponentLink4Description: https://datasheet.octopart.com:443/USBLC6-2P6-STMicroelectronics-datasheet-46285.pdf?src-supplier=Farnell; ComponentLink5URL: https://datasheet.octopart.com:443/USBLC6-2P6-STMicroelectronics-datasheet-14050643.pdf?src-supplier=iiiC; ComponentLink5Description: https://datasheet.octopart.com:443/USBLC6-2P6-STMicroelectronics-datasheet-14050643.pdf?src-supplier=iiiC; ComponentLink6URL: https://datasheet.octopart.com:443/USBLC6-2P6-STMicroelectronics-datasheet-7828165.pdf?src-supplier=Jameco; ComponentLink6Description: https://datasheet.octopart.com:443/USBLC6-2P6-STMicroelectronics-datasheet-7828165.pdf?src-supplier=Jameco
footprint SOT23-6 (SOT23, 6-Leads, Body 2.93x2.80mm, Pitch 0.95mm, IPC Medium Density)
pins: 1 IO1, 2 GND, 3 IO2, 4 IO2, 5 VBUS, 6 IO1

## X50328MSB2GI
designator X?
Passive Crystal Oscillators 8MHz ±10ppm 20pF 80Ω SMD5032-2P SMT -40℃~+85℃; Manufacturer: YXC; Supplier: LCSC; Supplier Part Number: C115962; Manufacturer Part Number: X50328MSB2GI
footprint 5x3.2x1.2mm Crystal
pins: 1, 2